# Altium footprint library Devkit.PcbLib: 84 footprints (part 4 of 6)
Each footprint in its own frame and in the unit in brackets; x right, y up, seen from the top. Pads: shape width x height; smd on the part's side, far side on the other; paste and mask are expansions set on the pad; w line width, h text height; cw(c..) or ccw(c..) is an arc to the next point about the centre after c.
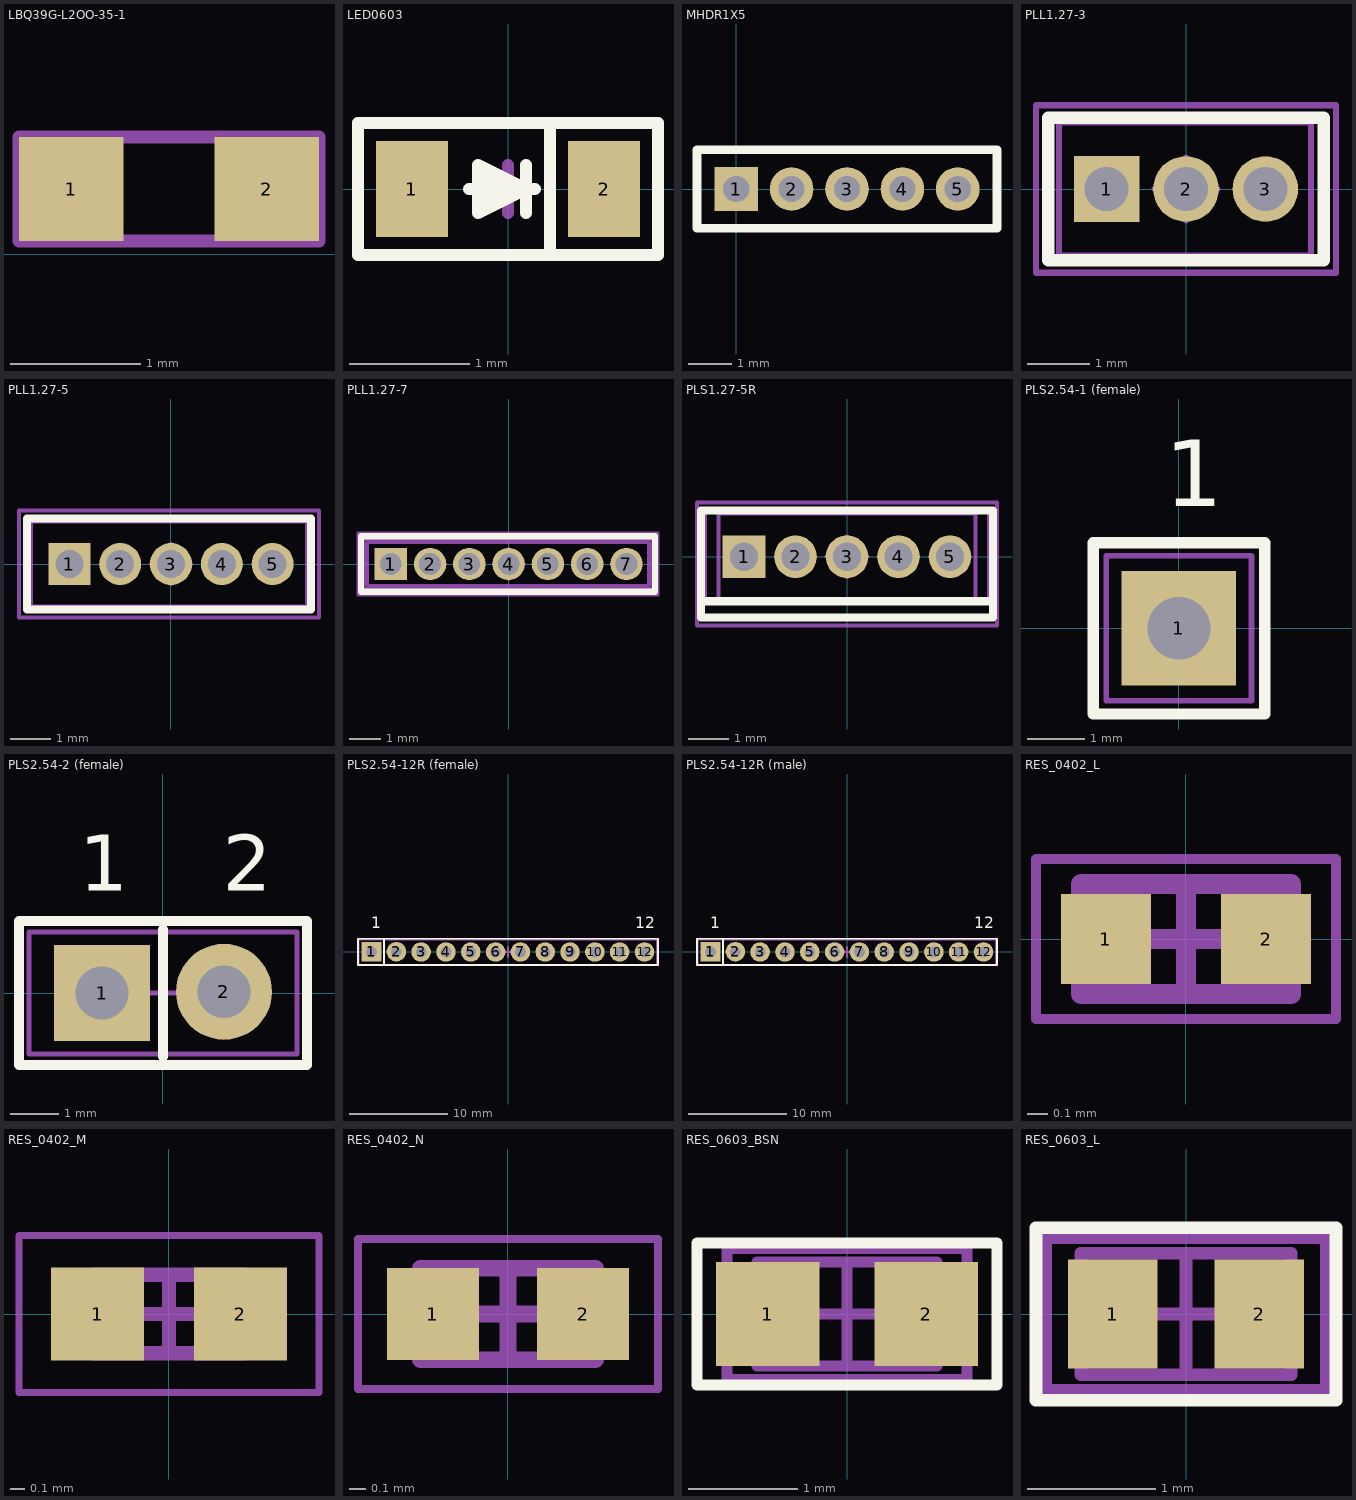
[diagram p3: the footprints below, top view; thin cyan lines are the x and y axes]

## LBQ39G-L2OO-35-1 [mm]
pads (2):
  rect 0.8x0.8 smd: 1(-2.5,0.5) 2(-1,0.5)
Mechanical 2:
  lines w0.1: -2.9,0.1 -0.6,0.1 -0.6,0.9 -2.9,0.9 -2.9,0.1
3D body: height 0.4, standoff 0, extent -2.9,0.1 -0.6,0.9

## LED0603 [mm]
height 0.7
pads (2):
  rect 0.6x0.8 smd: 1(-0.8,0) 2(0.8,0)
Top Overlay:
  lines w0.1: -0.325,0 -0.25,0 ; 0.15,-0.2 0.15,0.2 ; 0.225,0 0.15,0 ; 0.35,-0.55 0.35,0.525 ; 0.15,0 -0.25,0.2 -0.25,-0.2 0.15,0 ; -1.25,-0.55 1.25,-0.55 1.25,0.55 -1.25,0.55 -1.25,-0.55
  lines w0.254: -0.175,0 -0.025,0
Mechanical 15:
  lines w0.1: -0.2,0 0.2,0 ; 0,-0.2 0,0.2 ; -1.25,-0.55 -1.25,0.55 1.25,0.55 1.25,-0.55 -1.25,-0.55
3D body "LED 0603 APT1608 GREEN.STEP": height 0.75, standoff 0, extent -0.8,-0.4 0.8,0.4

## MHDR1X5 [mm] "Connector; Header; 5 Position"
pads (5):
  rect 1x1 hole 0.6: 1(0,0)
  round 1 hole 0.6: 2(1.27,0) 3(2.54,0) 4(3.81,0) 5(5.08,0)
Top Overlay:
  lines w0.2: -0.9,-0.9 5.98,-0.9 5.98,0.9 -0.9,0.9 -0.9,-0.9
3D body "pll5_body.STEP": height 4, standoff -2.8, extent -0.46,-1.016 5.54,0.984

## PLL1.27-3 [mm] "Pin Header, pitch 1.27 mm,"
height 5.65
pads (3):
  rect 1.05x1.05 hole 0.7: 1(-1.27,0)
  round 1.05 hole 0.7: 2(0,0) 3(1.27,0)
Top Overlay:
  lines w0.2: -2.2,-1.14 2.2,-1.14 2.2,1.14 -2.2,1.14 -2.2,-1.14
Mechanical 13:
  lines w0.1: -2.2,-1.14 2.159,-1.14 2.159,1.14 -2.2,1.14 -2.2,-1.14
Mechanical 15:
  lines w0.1: -0.5,0 0.5,0 ; 0,-0.5 0,0.5 ; -2.4,-1.34 -2.4,1.34 2.4,1.34 2.4,-1.34 -2.4,-1.34 ; -2.032,-1.065 -2.032,1.065 2,1.065 2,-1.065 -2.032,-1.065

## PLL1.27-5 [mm] "Pin Header, pitch 1.27 mm"
height 5.65
pads (5):
  rect 1.05x1.05 hole 0.7: 1(-2.54,0)
  round 1.05 hole 0.7: 2(-1.27,0) 3(0,0) 4(1.27,0) 5(2.54,0)
Top Overlay:
  lines w0.2: -3.6,-1.14 -3.6,1.14 3.5,1.14 3.5,-1.14 -3.6,-1.14
Mechanical 13:
  lines w0.1: -3.5,-1.14 -3.5,1.14 3.4,1.14 3.4,-1.14 -3.5,-1.14
Mechanical 15:
  lines w0.1: -0.5,0 0.5,0 ; 0,-0.5 0,0.5 ; -3.8,-1.34 3.7,-1.34 3.7,1.34 -3.8,1.34 -3.8,-1.34 ; -3.5,-1.065 -3.5,1.065 3.4,1.065 3.4,-1.065 -3.5,-1.065

## PLL1.27-7 [mm] "Pin Header, pitch 1.27 mm"
height 5.65
pads (7):
  rect 1.05x1.05 hole 0.7: 1(-3.81,0)
  round 1.05 hole 0.7: 2(-2.54,0) 3(-1.27,0) 4(0,0) 5(1.27,0) 6(2.54,0) 7(3.81,0)
Top Overlay:
  lines w0.2: -4.77,-0.9 4.73,-0.9 4.73,0.9 -4.77,0.9 -4.77,-0.9
Mechanical 13:
  lines w0.1: -4.57,-0.7 4.53,-0.7 4.53,0.7 -4.57,0.7 -4.57,-0.7
Mechanical 15:
  lines w0.1: -0.495,0 0.505,0 ; 0.005,-0.5 0.005,0.5 ; -4.87,-1 -4.87,1 4.83,1 4.83,-1 -4.87,-1 ; -4.67,-0.8 4.63,-0.8 4.63,0.8 -4.67,0.8 -4.67,-0.8

## PLS1.27-5R [mm] "Pin Header, pitch 1.27 mm"
height 5.65
pads (5):
  rect 1.05x1.05 hole 0.7: 1(-2.54,0)
  round 1.05 hole 0.7: 2(-1.27,0) 3(0,0) 4(1.27,0) 5(2.54,0)
Top Overlay:
  lines w0.2: -3.6,-1.1 3.6,-1.1 ; -3.6,-1.5 3.6,-1.5 3.6,-0.865 3.6,1.14 -3.6,1.14 -3.6,-0.865 -3.6,-1.5
Mechanical 13:
  lines w0.1: -3.5,-1.14 -3.5,1.14 3.5,1.14 3.5,-1.14 -3.5,-1.14
Mechanical 15:
  lines w0.1: -3.175,-1.065 3.175,-1.065 ; -3.175,-1.016 -3.175,1.065 3.175,1.065 3.175,-1.016 ; -0.5,0 0.5,0 ; 0,-0.5 0,0.5 ; -3.7,-1.7 3.7,-1.7 3.7,1.34 -3.7,1.34 -3.7,-1.7
3D body "m50-3930542_asm.stp": height 2.1, standoff -2.4, extent -3.15,-5.45 3.2,0.25

## PLS2.54-1 (female) [mm] "1  Pin Header, pitch 2.54 mm"
pads (1):
  rect 2x2 hole 1.1: 1(0,0)
Top Overlay:
  lines w0.2: -1.5,-1.5 -1.5,1.5 1.5,1.5 1.5,-1.5 -1.5,-1.5
  text "1" at -0.25,1.75 h2
Bottom Overlay:
  lines w0.2: -1.5,-1.5 1.5,-1.5 1.5,1.5 -1.5,1.5 -1.5,-1.5
  text "1" at 0.5,1.75 h2
Mechanical 13:
  lines w0.1: -1.27,-1.27 -1.27,1.27 1.27,1.27 1.27,-1.27 -1.27,-1.27
Mechanical 15:
  lines w0.1: -0.5,0 0.5,0 ; 0,-0.5 0,0.5 ; -1.27,-1.27 1.27,-1.27 1.27,1.27 -1.27,1.27 -1.27,-1.27

## PLS2.54-2 (female) [mm] "2 Pin Header, pitch 2.54 mm"
pads (2):
  rect 2x2 hole 1.1: 1(-1.27,0)
  round 2 hole 1.1: 2(1.27,0.025)
Top Overlay:
  lines w0.2: 0,-1.325 0,1.325 ; -3,-1.5 3,-1.5 3,1.5 -3,1.5 -3,-1.5
  text "1" at -1.75,1.75 h2
  text "2" at 1.25,1.75 h2
Bottom Overlay:
  lines w0.2: 0,-1.3 0,1.3 ; -3,-1.5 -3,1.5 3,1.5 3,-1.5 -3,-1.5
  text "2" at 2.25,1.75 h2
  text "1" at -1.25,1.75 h2
Mechanical 13:
  lines w0.1: 2.79,-1.27 -2.79,-1.27 -2.79,1.27 2.79,1.27 2.79,-1.25
Mechanical 15:
  lines w0.1: -0.5,0 0.5,0 ; 0,-0.5 0,0.5 ; -2.79,-1.27 -2.79,1.27 2.79,1.27 2.79,-1.27 -2.79,-1.27

## PLS2.54-12R (female) [mm] "12 Pin Header, pitch 2.54 mm"
height 6.9
pads (12):
  rect 2x2 hole 1.1: 1(-13.97,0)
  round 2 hole 1.1: 2(-11.43,0.025) 3(-8.89,0) 4(-6.35,0) 5(-3.81,0) 6(-1.27,0) 7(1.27,0) 8(3.81,0) 9(6.35,0) 10(8.89,0) 11(11.43,0) 12(13.97,0)
Top Overlay:
  lines w0.2: -12.7,-1.325 -12.7,1.325 ; -15.345,-1.35 15.345,-1.35 15.345,1.35 -15.345,1.35 -15.345,-1.35
  text "1" at -14,2 h2
  text "12" at 13,2 h2
Bottom Overlay:
  lines w0.2: -12.7,-1.3 -12.7,1.3 ; -15.35,-1.35 -15.35,1.35 15.35,1.35 15.35,-1.35 -15.35,-1.35
  text "12" at 15,2 h2
  text "1" at -13,2 h2
Mechanical 13:
  lines w0.1: -15.24,-1.25 15.24,-1.25 15.24,1.25 -15.24,1.25 -15.24,-1.25
Mechanical 15:
  lines w0.2: -0.5,0 0.5,0 ; 0,-0.5 0,0.5 ; -15.345,-1.35 -15.345,1.35 15.345,1.35 15.345,-1.35 -15.345,-1.35

## PLS2.54-12R (male) [mm] "12 Pin Header, pitch 2.54 mm"
height 6.9
pads (12):
  rect 2x2 hole 1.1: 1(-13.97,0)
  round 2 hole 1.1: 2(-11.43,0.025) 3(-8.89,0) 4(-6.35,0) 5(-3.81,0) 6(-1.27,0) 7(1.27,0) 8(3.81,0) 9(6.35,0) 10(8.89,0) 11(11.43,0) 12(13.97,0)
Top Overlay:
  lines w0.2: -12.7,-1.325 -12.7,1.325 ; -15.345,-1.35 -15.345,1.35 15.345,1.35 15.345,-1.35 -15.345,-1.35
  text "12" at 13,2 h2
  text "1" at -14,2 h2
Bottom Overlay:
  lines w0.2: -12.7,-1.3 -12.7,1.3 ; -15.35,-1.35 15.35,-1.35 15.35,1.35 -15.35,1.35 -15.35,-1.35
  text "1" at -13,2 h2
  text "12" at 15,2 h2
Mechanical 13:
  lines w0.1: -15.24,-1.25 -15.24,1.25 15.24,1.25 15.24,-1.25 -15.24,-1.25
Mechanical 15:
  lines w0.2: -0.5,0 0.5,0 ; 0,-0.5 0,0.5 ; -15.345,-1.35 15.345,-1.35 15.345,1.35 -15.345,1.35 -15.345,-1.35
3D body "User Library-PLS-6R gold.STEP": height 5.45, standoff -3, extent 0,-7.37 15.24,1.25
3D body "User Library-PLS-6R gold.STEP": height 5.45, standoff -3, extent -15.24,-7.37 0,1.25

## RES_0402_L [mm] "Chip Resistor, 2-Leads, Body 1.00x0.50mm, IPC High Density"
height 0.4
pads (2):
  rect 0.45x0.45 smd: 1(-0.4,0) 2(0.4,0)
Mechanical 13:
  lines w0.1: -0.525,-0.275 -0.525,0.275 0.525,0.275 0.525,-0.275 -0.525,-0.275
Mechanical 15:
  lines w0.05: -0.75,-0.4 -0.75,0.4 0.75,0.4 0.75,-0.4 -0.75,-0.4
  lines w0.1: -0.275,0 0.275,0 ; 0,-0.275 0,0.275
3D body: height 0.4, standoff 0, extent -0.275,-0.275 0.275,0.275
3D body: height 0.4, standoff 0, extent -0.525,-0.275 -0.275,0.275
3D body: height 0.4, standoff 0, extent 0.275,-0.275 0.525,0.275

## RES_0402_M [mm] "Chip Resistor, 2-Leads, Body 1.00x0.50mm, IPC Low Density"
height 0.4
pads (2):
  rect 0.65x0.65 smd: 1(-0.5,0) 2(0.5,0)
Mechanical 13:
  lines w0.1: -0.525,-0.275 0.525,-0.275 0.525,0.275 -0.525,0.275 -0.525,-0.275
Mechanical 15:
  lines w0.05: -1.05,-0.55 1.05,-0.55 1.05,0.55 -1.05,0.55 -1.05,-0.55
  lines w0.1: -0.275,0 0.275,0 ; 0,-0.275 0,0.275
3D body: height 0.4, standoff 0, extent 0.275,-0.275 0.525,0.275
3D body: height 0.4, standoff 0, extent -0.525,-0.275 -0.275,0.275
3D body: height 0.4, standoff 0, extent -0.275,-0.275 0.275,0.275

## RES_0402_N [mm] "Chip Resistor, 2-Leads, Body 1.00x0.50mm, IPC Medium Density"
height 0.4
pads (2):
  rect 0.55x0.55 smd: 1(-0.45,0) 2(0.45,0)
Mechanical 13:
  lines w0.1: -0.525,-0.275 -0.525,0.275 0.525,0.275 0.525,-0.275 -0.525,-0.275
Mechanical 15:
  lines w0.05: -0.9,-0.45 -0.9,0.45 0.9,0.45 0.9,-0.45 -0.9,-0.45
  lines w0.1: -0.275,0 0.275,0 ; 0,-0.275 0,0.275
3D body: height 0.4, standoff 0, extent -0.275,-0.275 0.275,0.275
3D body: height 0.4, standoff 0, extent -0.525,-0.275 -0.275,0.275
3D body: height 0.4, standoff 0, extent 0.275,-0.275 0.525,0.275

## RES_0603_BSN [mm] "2-Leads, Body 1.55x0.85mm"
height 0.5
pads (2):
  rect 0.95x0.95 smd: 1(-0.725,0) 2(0.725,0)
Top Overlay:
  lines w0.1: -1.375,-0.65 1.375,-0.65 1.375,0.65 -1.375,0.65 -1.375,-0.65
Mechanical 13:
  lines w0.1: -0.825,-0.475 0.825,-0.475 0.825,0.475 -0.825,0.475 -0.825,-0.475
Mechanical 15:
  lines w0.1: -0.475,0 0.475,0 ; 0,-0.475 0,0.475 ; -1.1,-0.6 -1.1,0.6 1.1,0.6 1.1,-0.6 -1.1,-0.6
3D body "User Library-R SMD 0603.STEP": height 0.46, standoff 0.01, extent -0.815,-0.425 0.825,0.425

## RES_0603_L [mm] "Chip Resistor, 2-Leads, Body 1.55x0.85mm, IPC High Density"
height 0.5
pads (2):
  rect 0.7x0.85 smd: 1(-0.575,0) 2(0.575,0)
Top Overlay:
  lines w0.1: -1.175,-0.675 -1.175,0.675 1.175,0.675 1.175,-0.675 -1.175,-0.675
Mechanical 13:
  lines w0.1: -0.825,-0.475 -0.825,0.475 0.825,0.475 0.825,-0.475 -0.825,-0.475
Mechanical 15:
  lines w0.1: -0.475,0 0.475,0 ; 0,-0.475 0,0.475 ; -1.1,-0.6 1.1,-0.6 1.1,0.6 -1.1,0.6 -1.1,-0.6
3D body: height 0.5, standoff 0, extent -0.525,-0.475 0.525,0.475
3D body: height 0.5, standoff 0, extent -0.825,-0.475 -0.525,0.475
3D body: height 0.5, standoff 0, extent 0.525,-0.475 0.825,0.475